# Altium footprint library IDETEC.PcbLib: 275 footprints (part 4 of 18)
Each footprint in its own frame and in the unit in brackets; x right, y up, seen from the top. Pads: shape width x height; smd on the part's side, far side on the other; paste and mask are expansions set on the pad; w line width, h text height; cw(c..) or ccw(c..) is an arc to the next point about the centre after c.
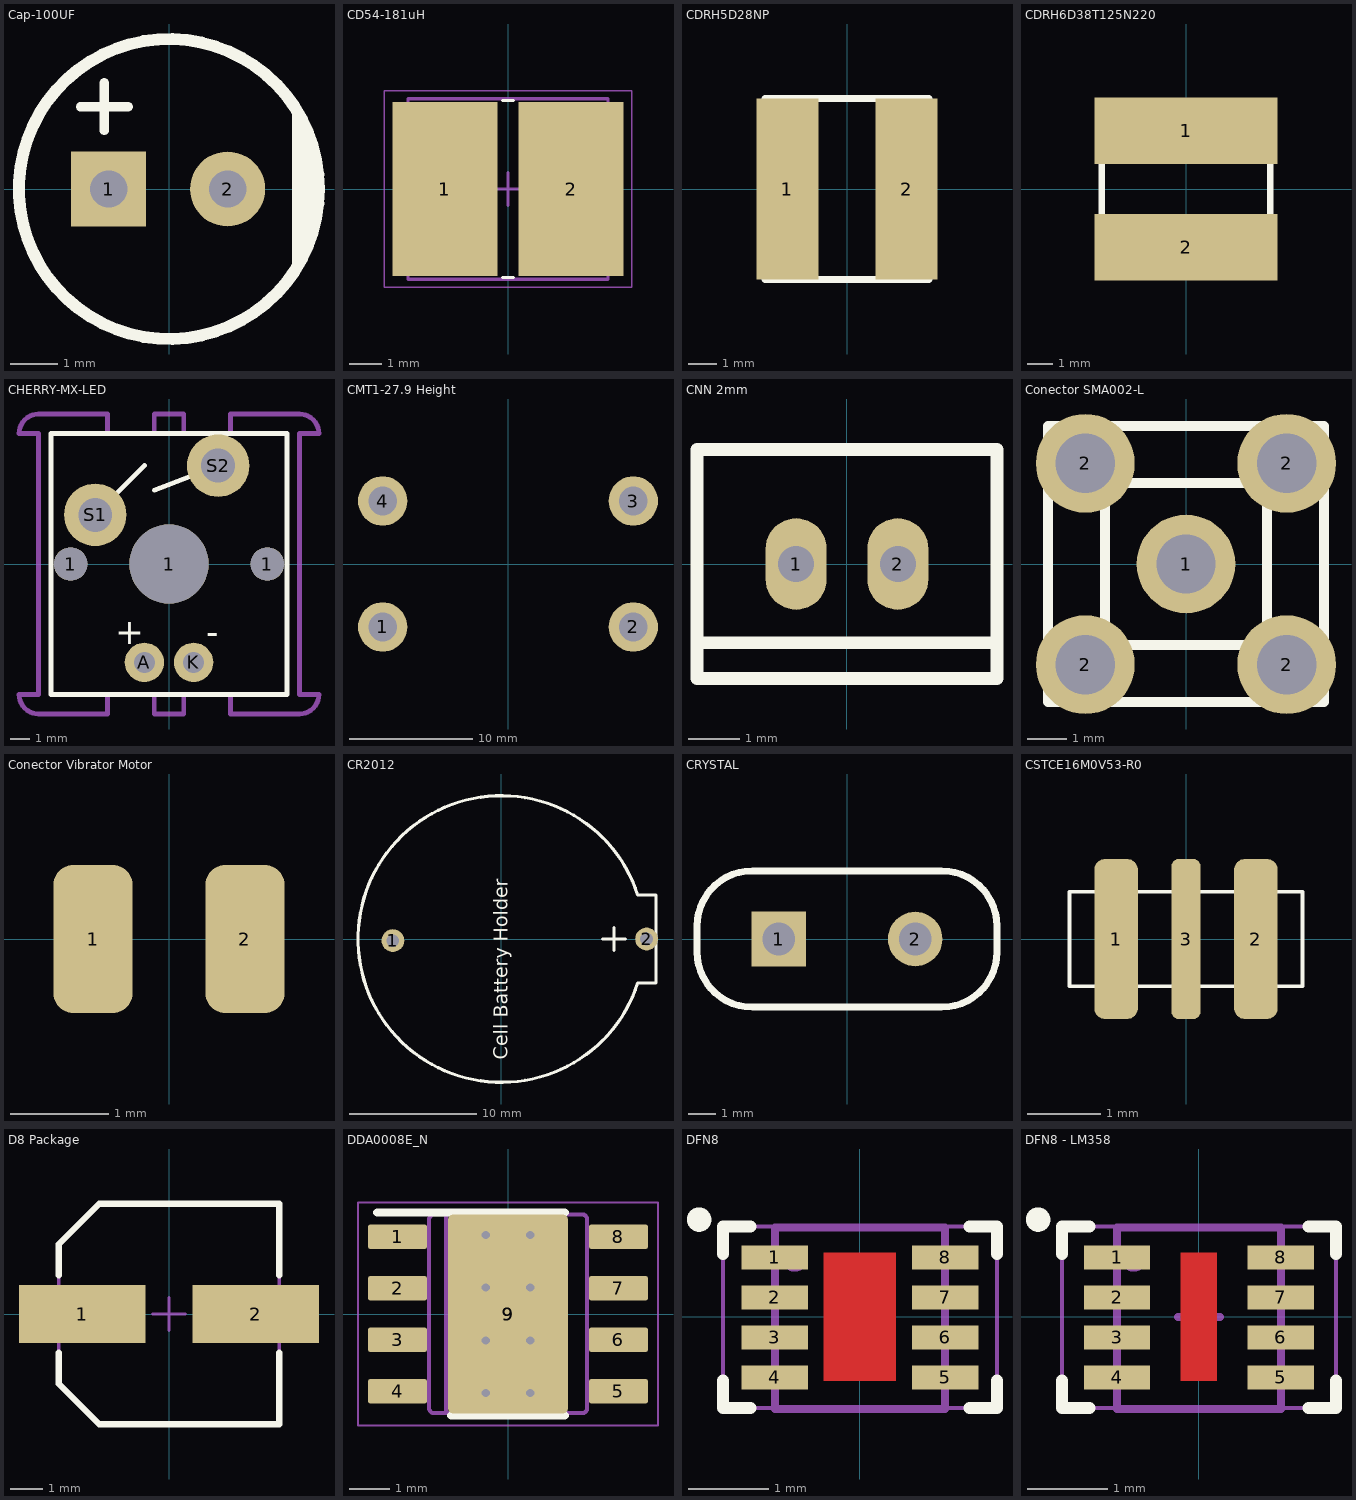
[diagram p3: the footprints below, top view; thin cyan lines are the x and y axes]

## Cap-100UF [mm] "capacitor de 100uF / 16V"
height 4
pads (2):
  rect 1.6x1.6 hole 0.8: 1(-1.29,0)
  round 1.6 hole 0.8: 2(1.25,0)
Top Overlay:
  circle w0.254: c0,0 r3.2
  lines w0.2: -1.888,1.755 -0.872,1.755 ; -1.38,1.247 -1.38,2.263
  lines w0.254: 2.75,-1.625 2.75,1.6 ; 2.95,-1 2.95,1.025
3D body "Capacitor Radial Electrolitic 630x1120.STEP": height 11.61, standoff -2.3, extent -3.15,-3.15 3.133,3.15

## CD54-181uH [mm] "Precision Wire Wound Inductor, 2-Leads, CD54-XXX"
height 5.4
pads (2):
  rect 3.2x5.3 smd: 1(-1.925,0) 2(1.925,0)
Top Overlay:
  lines w0.1: -0.17,-2.7 0.17,-2.7 ; -0.17,2.7 0.17,2.7
Mechanical 13:
  lines w0.1: -3.05,-2.75 -3.05,2.75 3.05,2.75 3.05,-2.75 -3.05,-2.75
Mechanical 15:
  lines w0.05: -3.775,-3 -3.775,3 3.775,3 3.775,-3 -3.775,-3
  lines w0.1: -0.5,0 0.5,0 ; 0,-0.5 0,0.5
3D body "User Library-SDR0604.STEP": height 4.55, standoff 0, extent -2.754,-2.8 2.754,2.8

## CDRH5D28NP [mm] "CDRH5D28NP"
pads (2):
  rect 2.15x6.3 smd: 1(-2.075,0) 2(2.075,0)
Top Overlay:
  lines w0.254: -2.85,-3.15 2.85,-3.15 2.85,3.15 -2.85,3.15 -2.85,-3.15
3D body "User Library-Sumida_CDPH4D19FNP-6R8MC.STEP": height 1.9, standoff -0.03, extent -2.45,-2.45 2.45,2.45

## CDRH6D38T125N220 [mm] "CDRH6D38T125N220"
pads (2):
  rect 7.3x2.65 smd: 1(0,2.325) 2(0,-2.325)
Top Overlay:
  lines w0.254: -3.35,-3.35 3.35,-3.35 3.35,3.35 -3.35,3.35 -3.35,-3.35

## CHERRY-MX-LED [mil] "CHERRY-MX-LED"
pads (7):
  round 68 hole 68: 1(-200,0) 1(200,0)
  round 161 hole 161: 1(0,0)
  round 80 hole 43: A(-50,-200) K(50,-200)
  round 127 hole 69: S1(-150,100) S2(100,200)
Top Overlay:
  lines w10: -150,100 -50,200 ; -30,150 100,200 ; -240,-265 240,-265 240,265 -240,265 -240,-265
  text "+" at -109.61,-162.83 h51
  text "-" at 75.39,-162.83 h51
Mechanical 16:
  lines w10: -305,-265 ccw(c-265,-265) -265,-305 -125,-305 -125,-265 -30,-265 -30,-305 30,-305 30,-265 125,-265 125,-305 265,-305 ccw(c265,-265) 305,-265 265,-265 265,265 305,265 ccw(c265,265) 265,305 125,305 125,265 30,265 30,305 -30,305 -30,265 -125,265 -125,305 -265,305 ccw(c-265,265) -305,265 -265,265 -265,-265 -305,-265
3D body "User Library-MX-Blue.STEP": height 610.24, standoff -133.86, extent -307.09,-307.72 307.09,306.46

## CMT1-27.9 Height [mm] "Common Mode Line Chokes - CMT Series, HxLxW 27.9x30.7x15.9"
height 27.9
pads (4):
  round 4 hole 2.32: 1(-10.15,-5.1) 2(10.15,-5.1) 3(10.15,5.1) 4(-10.15,5.1)
3D body "Coilcraft-CMT1_3.STEP": height 27.9, standoff -4.57, extent -12.8,-8.15 12.8,7.95

## CNN 2mm [mm] "Conector 2.00mm bateria"
height 5
pads (2):
  oval 1.2x1.8 hole 0.71: 1(-1,0) 2(1,0)
Top Overlay:
  lines w0.25: -2.95,-1.549 2.95,-1.549 ; -2.95,-2.25 2.95,-2.25 2.95,2.25 -2.95,2.25 -2.95,-2.25
3D body "User Library-B2B-PH-K-S(LF)(SN).STEP": height 6, standoff -3.4, extent -2.95,-2.25 2.95,2.25

## Conector SMA002-L [mm] "Antena RF"
height 4
pads (5):
  round 2.5 hole 1.5: 1(0,0) 2(-2.55,-2.55) 2(-2.55,2.55) 2(2.55,-2.55) 2(2.55,2.55)
Top Overlay:
  lines w0.254: -3.5,-3.5 -3.5,3.5 3.5,3.5 3.5,-3.5 -3.5,-3.5 ; -2.05,-2.05 2.05,-2.05 2.05,2.05 -2.05,2.05 -2.05,-2.05
3D body "7644.STEP": height 9.85, standoff -3.68, extent -3.195,-3.175 3.145,11.646
3D body "User Library-433Mhz Antenna.STEP": height 88.63, standoff 1.73, extent -4.59,7.803 4.775,40.947

## Conector Vibrator Motor [mm] "Conector de vibrador"
height 2
pads (2):
  rrect50% 0.8x1.5 smd: 1(-0.77,0) 2(0.77,0)

## CR2012 [mm] "Battery socket"
height 2
pads (2):
  round 1.8 hole 1: 1(-8.55,-0.127) 2(11.45,0)
Top Overlay:
  lines w0.254: 8.001,0 9.779,0 ; 8.89,-0.889 8.89,0.889 ; 10.744,-3.5 cw(c0,0) 10.744,3.5 ; 10.744,-3.475 12.2,-3.475 12.2,3.475 10.744,3.475
  text "Cell Battery Holder" at 0.508,-9.525 h1.1
3D body "User Library-CR 2032 (Battery Holder)-1.STEP": height 6.55, standoff -4, extent -11.6,-11.525 17.1,11.225

## CRYSTAL [mm] "Cristal de Quarzo"
pads (2):
  rect 2x2 hole 1.2: 1(-2.5,0)
  round 2 hole 1.2: 2(2.5,0)
Top Overlay:
  lines w0.254: -5.5,-0.472 ccw(c-3.472,-0.472) -3.472,-2.5 3.472,-2.5 ccw(c3.472,-0.472) 5.5,-0.472 5.5,0.472 ccw(c3.472,0.472) 3.472,2.5 -3.472,2.5 ccw(c-3.472,0.472) -5.5,0.472 -5.5,-0.472
3D body "User Library-HC-49_LT_THT_16MHz.STEP": height 4.1, standoff -1.49, extent -5.674,-2.325 5.676,2.325

## CSTCE16M0V53-R0 [mm] "CER RESONATOR 16.0MHZ SMD"
height 1
pads (3):
  rrect50% 0.6x2.2 smd: 1(-0.96,0) 2(0.96,0)
  rrect50% 0.4x2.2 smd: 3(0,0)
Top Overlay:
  lines w0.05: -1.6,-0.65 -1.6,0.65 0,0.65 1.6,0.65 1.6,-0.65 0,-0.65 -1.6,-0.65
3D body "SW3dPS-CSTCE_V-1.STEP": height 1.02, standoff -0.09, extent -1.6,-0.65 1.6,0.65

## D8 Package [mm] "125degC 6.3 x 7.7mm SMD"
height 7.7
pads (2):
  rect 3.9x1.8 smd: 1(-2.675,0) 2(2.675,0)
Top Overlay:
  lines w0.2: -3.4,-1.2 -3.4,-2.15 -2.15,-3.4 3.4,-3.4 3.4,-1.2 ; -3.4,1.2 -3.4,2.15 -2.15,3.4 3.4,3.4 3.4,1.2
Mechanical 13:
  lines w0.1: -3.4,-2.15 -2.15,-3.4 3.4,-3.4 3.4,3.4 -2.15,3.4 -3.4,2.15 -3.4,-2.15
Mechanical 15:
  lines w0.1: -0.5,0 0.5,0 ; 0,-0.5 0,0.5
3D body "User Library-ALU-D8.STEP": height 7.7, standoff 0, extent -3.5,-3.3 3.5,3.3

## DDA0008E_N [mm]
height 1.7
pads (11):
  rrect17% 1.45x0.6 smd: 1(-2.725,1.905) 2(-2.725,0.635) 3(-2.725,-0.635) 4(-2.725,-1.905) 5(2.725,-1.905) 6(2.725,-0.635) 7(2.725,0.635) 8(2.725,1.905)
  rrect7% 2.95x4.9 smd paste-1.5 mask-1.5: 9(0,0)
  rrect4% 2.4x3.1 on Top Paste: 9(0,0)
  rrect4% 2.4x3.1 on Top Solder: 9(0,0)
via -0.55,0.65 diameter 0.5 hole 0.2
via 0.55,0.65 diameter 0.5 hole 0.2
via -0.55,-0.65 diameter 0.5 hole 0.2
via 0.55,-0.65 diameter 0.5 hole 0.2
via 0.55,1.95 diameter 0.5 hole 0.2
via -0.55,1.95 diameter 0.5 hole 0.2
via -0.55,-1.95 diameter 0.5 hole 0.2
via 0.55,-1.95 diameter 0.5 hole 0.2
Top Overlay:
  lines w0.2: -3.225,2.5 1.4,2.5 ; -1.4,-2.5 1.4,-2.5
Mechanical 6:
  lines w0.1: -1.946,-2.321 ccw(c-1.819,-2.32) -1.82,-2.447 ; -1.946,-2.321 -1.946,-2.32 -1.946,2.329 ; -1.946,2.33 cw(c-1.819,2.329) -1.82,2.456 ; -1.524,-2.447 -1.524,2.456 ; -1.946,2.329 -1.946,2.33 ; -1.82,-2.447 -1.819,-2.447 ; -1.819,-2.447 1.826,-2.447 1.827,-2.447 ccw(c1.826,-2.32) 1.953,-2.321 1.953,-2.32 1.953,2.329 ; -1.819,2.456 1.826,2.456 1.827,2.456 cw(c1.826,2.329) 1.953,2.33 ; -1.82,2.456 -1.819,2.456 ; 1.953,2.33 1.953,2.329 ; -2.975,-2.091 -2.614,-2.091 -2.497,-2.091 -2.473,-2.091 -2.144,-2.091 -1.946,-2.091 -1.946,-1.71 -2.144,-1.71 -2.473,-1.71 -2.497,-1.71 -2.614,-1.71 -2.975,-1.71 -2.975,-2.091 ; -2.975,-0.821 -2.614,-0.821 -2.497,-0.821 -2.473,-0.821 -2.144,-0.821 -1.946,-0.821 -1.946,-0.44 -2.144,-0.44 -2.473,-0.44 -2.497,-0.44 -2.614,-0.44 -2.975,-0.44 -2.975,-0.821 ; -2.975,0.449 -2.614,0.449 -2.497,0.449 -2.473,0.449 -2.144,0.449 -1.946,0.449 -1.946,0.83 -2.144,0.83 -2.473,0.83 -2.497,0.83 -2.614,0.83 -2.975,0.83 -2.975,0.449 ; -2.975,1.719 -2.614,1.719 -2.497,1.719 -2.473,1.719 -2.144,1.719 -1.946,1.719 -1.946,2.1 -2.144,2.1 -2.473,2.1 -2.497,2.1 -2.614,2.1 -2.975,2.1 -2.975,1.719 ; -0.632,1.16 cw(c-0.632,1.478) -0.632,1.795 cw(c-0.632,1.478) -0.632,1.16 ; 1.953,-2.091 2.15,-2.091 2.479,-2.091 2.503,-2.091 2.621,-2.091 2.981,-2.091 2.981,-1.71 2.621,-1.71 2.503,-1.71 2.479,-1.71 2.15,-1.71 1.953,-1.71 1.953,-2.091 ; 1.953,-0.821 2.15,-0.821 2.479,-0.821 2.503,-0.821 2.621,-0.821 2.981,-0.821 2.981,-0.44 2.621,-0.44 2.503,-0.44 2.479,-0.44 2.15,-0.44 1.953,-0.44 1.953,-0.821 ; 1.953,0.449 2.15,0.449 2.479,0.449 2.503,0.449 2.621,0.449 2.981,0.449 2.981,0.83 2.621,0.83 2.503,0.83 2.479,0.83 2.15,0.83 1.953,0.83 1.953,0.449 ; 1.953,1.719 2.15,1.719 2.479,1.719 2.503,1.719 2.621,1.719 2.981,1.719 2.981,2.1 2.621,2.1 2.503,2.1 2.479,2.1 2.15,2.1 1.953,2.1 1.953,1.719
Mechanical 15:
  lines w0.05: -3.7,-2.75 -3.7,2.75 3.7,2.75 3.7,-2.75 -3.7,-2.75
Mechanical 16:
  lines w0.1: -0.5,0 0.5,0 ; 0,-0.5 0,0.5
3D body "DDA0008E.stp": height 1.57, standoff 0, extent -3,-2.45 3,2.45

## DFN8 [mm] "DFN-8 2X2 mm"
height 4.5
pads (8):
  rect 0.83x0.3 smd mask+0.06: 1(-1.065,0.744) 2(-1.065,0.244) 3(-1.065,-0.256) 4(-1.065,-0.756) 5(1.065,-0.756) 6(1.065,-0.256) 7(1.065,0.244) 8(1.065,0.744)
Top Layer:
  region: -0.45,-0.8 -0.45,0.8 0.45,0.8 0.45,-0.8
Top Overlay:
  circle w0.25: c-2.011,1.216 r0.027
  lines w0.15: -1.714,-0.798 -1.714,-1.141 -1.371,-1.141 ; -1.714,0.786 -1.714,1.129 -1.371,1.129 ; 1.371,-1.141 1.714,-1.141 1.714,-0.798 ; 1.371,1.13 1.714,1.129 1.714,0.786
Mechanical 13:
  circle w0.1: c-0.814,0.721 r0.106
  lines w0.1: -1.065,-1.149 -1.065,1.121 1.065,1.121 1.065,-1.149 -1.065,-1.149
Mechanical 15:
  lines w0.05: -1.714,-1.141 -1.714,1.129 1.714,1.129 1.714,-1.141 -1.714,-1.141
  lines w0.1: -0.264,0 0.263,0 ; 0,-0.264 0,0.263
3D body "User Library-DFN 8.STEP": height 0.75, standoff -0.05, extent -1.001,-1 1.001,1

## DFN8 - LM358 [mm] "DFN-8 2X2 mm"
height 4.5
pads (8):
  rect 0.83x0.3 smd mask+0.06: 1(-1.025,0.744) 2(-1.025,0.244) 3(-1.025,-0.256) 4(-1.025,-0.756) 5(1.025,-0.756) 6(1.025,-0.256) 7(1.025,0.244) 8(1.025,0.744)
Top Layer:
  region: -0.225,-0.8 0.225,-0.8 0.225,0.8 -0.225,0.8
Top Overlay:
  circle w0.25: c-2.011,1.216 r0.027
  lines w0.15: -1.714,-0.798 -1.714,-1.141 -1.371,-1.141 ; -1.714,0.786 -1.714,1.129 -1.371,1.129 ; 1.371,-1.141 1.714,-1.141 1.714,-0.798 ; 1.371,1.13 1.714,1.129 1.714,0.786
Mechanical 13:
  circle w0.1: c-0.814,0.721 r0.106
  lines w0.1: -1.025,-1.149 1.025,-1.149 1.025,1.121 -1.025,1.121 -1.025,-1.149
Mechanical 15:
  lines w0.05: -1.714,-1.141 1.714,-1.141 1.714,1.129 -1.714,1.129 -1.714,-1.141
  lines w0.1: -0.264,0 0.263,0 ; 0,-0.264 0,0.263
3D body "User Library-DFN 8.STEP": height 0.75, standoff -0.05, extent -1.001,-1 1.001,1